# Altium footprint library Vowstar_Basic_Device.PcbLib: 170 footprints (part 7 of 11)
Each footprint in its own frame and in the unit in brackets; x right, y up, seen from the top. Pads: shape width x height; smd on the part's side, far side on the other; paste and mask are expansions set on the pad; w line width, h text height; cw(c..) or ccw(c..) is an arc to the next point about the centre after c.
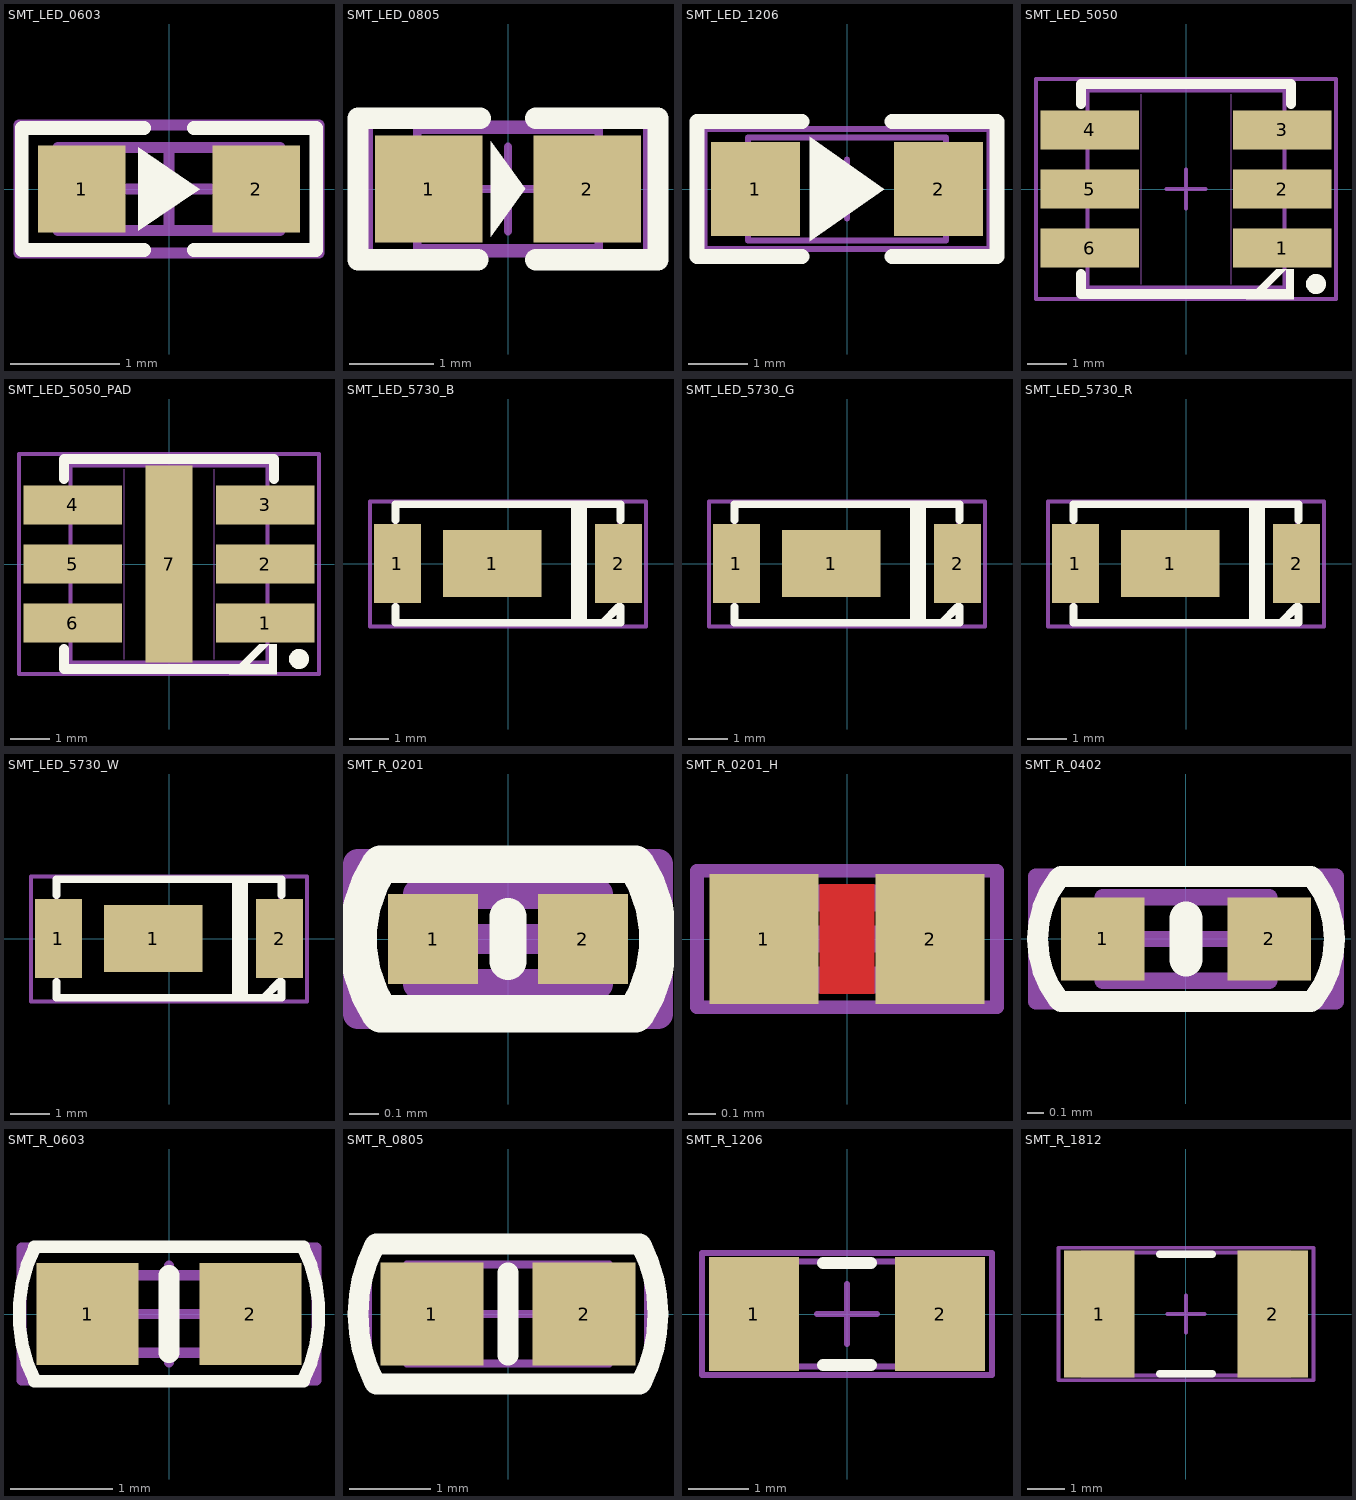
[diagram p6: the footprints below, top view; thin cyan lines are the x and y axes]

## SMT_LED_0603 [mm] "SMT LED"
height 0.85
pads (2):
  rect 0.8x0.8 smd: 1(-0.8,0) 2(0.8,0)
Top Overlay:
  region: -0.279,0.381 0.279,0 -0.279,-0.381
  lines w0.127: -0.229,-0.559 -1.346,-0.559 -1.346,0.559 -0.229,0.559 ; 0.229,-0.559 1.346,-0.559 1.346,0.559 0.229,0.559
Mechanical 13:
  lines w0.1: -1.016,-0.381 -1.016,0.381 1.016,0.381 1.016,-0.381 -1.016,-0.381
Mechanical 15:
  lines w0.1: -0.381,0 0.381,0 ; 0,-0.381 0,0.381 ; -1.372,-0.584 -1.372,0.584 1.372,0.584 1.372,-0.584 -1.372,-0.584
3D body "User Library-0603(1608M) LED.step": height 0.6, standoff 0, extent -0.81,-0.4 0.81,0.4

## SMT_LED_0805 [mil] "SMT LED"
height 60
pads (2):
  rect 50x50 smd: 1(-37,0) 2(37,0)
Top Overlay:
  region: -8,22.22 8,0 -8,-22.22
  lines w10: -14,-33 -70,-33 -70,33 -13,33 ; 13,-33 70,-33 70,33 13,33
Mechanical 13:
  lines w3.94: -42.32,-27.56 42.32,-27.56 42.32,27.56 -42.32,27.56 -42.32,-27.56
Mechanical 15:
  lines w3.94: -19.69,0 19.68,0 ; 0,-19.68 0,19.69 ; -65,-30 65,-30 65,30 -65,30 -65,-30
3D body "User Library-0805(2012M) LED.step": height 43.31, standoff 0, extent -39.53,-24.21 40,25

## SMT_LED_1206 [mm] "Surface mount resistor 1206"
height 0.71
pads (2):
  rect 1.5x1.6 smd: 1(-1.55,0) 2(1.55,0)
Top Overlay:
  region: -0.635,0.889 0.635,0 -0.635,-0.889
  lines w0.254: -0.762,-1.143 -2.54,-1.143 -2.54,1.143 -0.762,1.143 ; 0.762,-1.143 2.54,-1.143 2.54,1.143 0.762,1.143
Mechanical 13:
  lines w0.1: -1.675,-0.875 -1.675,0.875 1.675,0.875 1.675,-0.875 -1.675,-0.875
Mechanical 15:
  lines w0.1: -0.5,0 0.5,0 ; 0,-0.5 0,0.5 ; -2.413,-1.016 -2.413,1.016 2.413,1.016 2.413,-1.016 -2.413,-1.016
3D body "User Library-1206(3216M) LED.step": height 1.1, standoff 0, extent -1.61,-0.8 1.61,0.8

## SMT_LED_5050 [mm] "SMT LED"
height 1.3
pads (6):
  rect 2.5x1 smd: 1(2.45,-1.5) 2(2.45,0) 3(2.45,1.5) 4(-2.45,1.5) 5(-2.45,0) 6(-2.45,-1.5)
Top Overlay:
  circle w0.254: c3.302,-2.413 r0.127
  region: 1.524,-2.794 2.73,-2.794 2.73,-2.032 2.54,-2.032 2.54,-2.54 2.032,-2.54 2.54,-2.032 2.286,-2.032
  lines w0.254: -2.667,-2.159 -2.667,-2.667 1.778,-2.667 ; -2.667,2.159 -2.667,2.667 2.667,2.667 2.667,2.159
Mechanical 13:
  lines w0.02: -1.143,-2.413 -1.143,2.413 ; 1.143,-2.413 1.143,2.413
  lines w0.1: -2.5,-2.5 -2.5,2.5 2.5,2.5 2.5,-2.5 -2.5,-2.5
Mechanical 15:
  lines w0.1: -0.5,0 0.5,0 ; 0,-0.5 0,0.5 ; -3.81,-2.794 -3.81,2.794 3.81,2.794 3.81,-2.794 -3.81,-2.794
3D body "User Library-LED-SMD-5050.step": height 1.6, standoff 0, extent -2.65,-2.5 2.65,2.5

## SMT_LED_5050_PAD [mm] "SMT LED"
height 1.3
pads (7):
  rect 2.5x1 smd: 1(2.45,-1.5) 2(2.45,0) 3(2.45,1.5) 4(-2.45,1.5) 5(-2.45,0) 6(-2.45,-1.5)
  rect 1.2x5 smd: 7(0,0)
Top Overlay:
  circle w0.254: c3.302,-2.413 r0.127
  region: 1.524,-2.794 2.73,-2.794 2.73,-2.032 2.54,-2.032 2.54,-2.54 2.032,-2.54 2.54,-2.032 2.286,-2.032
  lines w0.254: -2.667,-2.159 -2.667,-2.667 1.778,-2.667 ; -2.667,2.159 -2.667,2.667 2.667,2.667 2.667,2.159
Mechanical 13:
  lines w0.02: -1.143,-2.413 -1.143,2.413 ; 1.143,-2.413 1.143,2.413
  lines w0.1: -2.5,-2.5 2.5,-2.5 2.5,2.5 -2.5,2.5 -2.5,-2.5
Mechanical 15:
  lines w0.1: -0.5,0 0.5,0 ; 0,-0.5 0,0.5 ; -3.81,-2.794 3.81,-2.794 3.81,2.794 -3.81,2.794 -3.81,-2.794
3D body "User Library-LED-SMD-5050.step": height 1.6, standoff 0, extent -2.65,-2.5 2.65,2.5

## SMT_LED_5730_B [mm] "SMT LED 5730 Package"
height 0.85
pads (3):
  rect 1.2x2 smd: 1(-2.8,0) 2(2.8,0)
  rect 2.5x1.7 smd: 1(-0.4,0)
Top Overlay:
  rectangle: 1.6,-1.5 2,1.5
  lines w0.2: -2.85,-1.1 -2.85,-1.5 2.85,-1.5 2.85,-1.1 ; -2.85,1.1 -2.85,1.5 2.85,1.5 2.85,1.1 ; 2.4,-1.5 2.8,-1.1
Mechanical 13:
  lines w0.1: -2.85,-1.5 2.825,-1.5 2.825,1.475 -2.85,1.475 -2.85,-1.5
Mechanical 15:
  lines w0.1: -0.5,0 0.5,0 ; 0,-0.5 0,0.5 ; -3.5,-1.6 -3.5,1.575 3.5,1.575 3.5,-1.6 -3.5,-1.6
3D body "B.STEP": height 0.9, standoff 0, extent -2.839,-1.499 2.861,1.501

## SMT_LED_5730_G [mm] "SMT LED 5730 Package"
height 0.85
pads (3):
  rect 1.2x2 smd: 1(-2.8,0) 2(2.8,0)
  rect 2.5x1.7 smd: 1(-0.4,0)
Top Overlay:
  rectangle: 1.6,-1.5 2,1.5
  lines w0.2: -2.85,-1.1 -2.85,-1.5 2.85,-1.5 2.85,-1.1 ; -2.85,1.1 -2.85,1.5 2.85,1.5 2.85,1.1 ; 2.4,-1.5 2.8,-1.1
Mechanical 13:
  lines w0.1: -2.85,-1.5 2.825,-1.5 2.825,1.475 -2.85,1.475 -2.85,-1.5
Mechanical 15:
  lines w0.1: -0.5,0 0.5,0 ; 0,-0.5 0,0.5 ; -3.5,-1.6 -3.5,1.575 3.5,1.575 3.5,-1.6 -3.5,-1.6
3D body "G.STEP": height 0.9, standoff 0, extent -2.845,-1.5 2.855,1.5

## SMT_LED_5730_R [mm] "SMT LED 5730 Package"
height 0.85
pads (3):
  rect 1.2x2 smd: 1(-2.8,0) 2(2.8,0)
  rect 2.5x1.7 smd: 1(-0.4,0)
Top Overlay:
  rectangle: 1.6,-1.5 2,1.5
  lines w0.2: -2.85,-1.1 -2.85,-1.5 2.85,-1.5 2.85,-1.1 ; -2.85,1.1 -2.85,1.5 2.85,1.5 2.85,1.1 ; 2.4,-1.5 2.8,-1.1
Mechanical 13:
  lines w0.1: -2.85,-1.5 2.825,-1.5 2.825,1.475 -2.85,1.475 -2.85,-1.5
Mechanical 15:
  lines w0.1: -0.5,0 0.5,0 ; 0,-0.5 0,0.5 ; -3.5,-1.6 -3.5,1.575 3.5,1.575 3.5,-1.6 -3.5,-1.6
3D body "R.STEP": height 0.9, standoff 0, extent -2.845,-1.499 2.855,1.501

## SMT_LED_5730_W [mm] "SMT LED 5730 Package"
height 0.85
pads (3):
  rect 1.2x2 smd: 1(-2.8,0) 2(2.8,0)
  rect 2.5x1.7 smd: 1(-0.4,0)
Top Overlay:
  rectangle: 1.6,-1.5 2,1.5
  lines w0.2: -2.85,-1.1 -2.85,-1.5 2.85,-1.5 2.85,-1.1 ; -2.85,1.1 -2.85,1.5 2.85,1.5 2.85,1.1 ; 2.4,-1.5 2.8,-1.1
Mechanical 13:
  lines w0.1: -2.85,-1.5 -2.85,1.475 2.825,1.475 2.825,-1.5 -2.85,-1.5
Mechanical 15:
  lines w0.1: -0.5,0 0.5,0 ; 0,-0.5 0,0.5 ; -3.5,-1.6 3.5,-1.6 3.5,1.575 -3.5,1.575 -3.5,-1.6
3D body "User Library-PLCC-2white.STEP": height 0.9, standoff 0, extent -2.86,-1.51 2.84,1.49

## SMT_R_0201 [mil] "Surface mount resistor 0201"
height 11.81
pads (2):
  rect 12x12 smd: 1(-10,0) 2(10,0)
Top Overlay:
  lines w5: 0,-3 0,3 ; -17,-10 cw(c-1.83,0) -17,10 17,10 cw(c1.83,0) 17,-10 -17,-10
Mechanical 13:
  lines w3.94: -12,-6 -12,6 12,6 12,-6 -12,-6
Mechanical 15:
  lines w3.94: -5,0 5,0 ; 0,-5 0,5 ; -20,-10 -20,10 20,10 20,-10 -20,-10
3D body "User Library-0201(0603M) Res.step": height 12.1, standoff 0, extent -11.99,-5.99 12.01,6.01

## SMT_R_0201_H [mm] "Chip Resistor, 2-Leads, Body 0.60x0.30mm, IPC High Density"
height 0.2
pads (2):
  rect 0.4x0.475 smd paste-1 mask-1: 1(-0.305,0) 2(0.305,0)
Top Layer:
  pour cut-out: -0.1,0.2 -0.1,-0.2 0.1,-0.2 0.1,0.2
Top Paste:
  region: 0.43,0.163 0.105,0.163 0.105,-0.162 0.43,-0.162
  rectangle: -0.43,-0.162 -0.105,0.162
Top Solder:
  rectangle: -0.43,-0.163 0.43,0.162
Mechanical 13:
  lines w0.1: -0.3,-0.15 -0.3,0.15 0.3,0.15 0.3,-0.15 -0.3,-0.15
Mechanical 15:
  lines w0.05: -0.55,-0.25 -0.55,0.25 0.55,0.25 0.55,-0.25 -0.55,-0.25
  lines w0.1: -0.15,0 0.15,0 ; 0,-0.15 0,0.15
3D body "User Library-0201(0603M) Res.step": height 0.31, standoff 0, extent -0.305,-0.152 0.305,0.153

## SMT_R_0402 [mil] "Surface mount resistor 0402"
height 11.81
pads (2):
  rect 20x20 smd: 1(-20,0) 2(20,0)
Top Overlay:
  lines w5: -30.54,-14.64 cw(c-12,0) -30.54,14.64 ; -30,-15 30,-15 ; -30,15 30,15 ; 30.54,-14.64 ccw(c12,0) 30.54,14.64
  lines w8: 0,-5 0,5
Mechanical 13:
  lines w3.94: -20,-10 -20,10 20,10 20,-10 -20,-10
Mechanical 15:
  lines w3.94: -10,0 10,0 ; 0,-10 0,10 ; -36,-15 -36,15 36,15 36,-15 -36,-15
3D body "User Library-0402(1005M) Res.step": height 20.1, standoff 0, extent -20,-10 20,10

## SMT_R_0603 [mm] "Surface mount resistor 0603"
height 0.85
pads (2):
  rect 1x1 smd: 1(-0.8,0) 2(0.8,0)
Top Overlay:
  lines w0.127: -1.321,-0.66 1.321,-0.66 ; -1.321,0.66 1.321,0.66 ; -1.318,-0.659 cw(c0,0) -1.318,0.659 ; 1.318,-0.659 ccw(c0,0) 1.318,0.659
  lines w0.203: 0,-0.381 0,0.381
Mechanical 13:
  lines w0.1: -1.016,-0.381 1.016,-0.381 1.016,0.381 -1.016,0.381 -1.016,-0.381
Mechanical 15:
  lines w0.1: -0.475,0 0.475,0 ; 0,-0.475 0,0.475 ; -1.448,-0.65 1.448,-0.65 1.448,0.65 -1.448,0.65 -1.448,-0.65
3D body "User Library-0603 SMD Resistor.step": height 0.79, standoff 0, extent -1,-0.394 1,0.394

## SMT_R_0805 [mil] "Surface mount resistor 0805"
height 70
pads (2):
  rect 50x50 smd: 1(-37,0) 2(37,0)
Top Overlay:
  lines w10: -64.54,-33.76 cw(c0,0) -64.54,33.76 ; -64,-34 64,-34 ; -64,34 64,34 ; 0,-20 0,20 ; 64.54,-33.76 ccw(c0,0) 64.54,33.76
Mechanical 13:
  lines w3.94: -49,-24 49,-24 49,24 -49,24 -49,-24
Mechanical 15:
  lines w3.94: -19.68,0 19.69,0 ; 0,-19.69 0,19.68 ; -68,-31 -68,31 68,31 68,-31 -68,-31
3D body "User Library-0805(2012M) Res.step": height 31.1, standoff 0, extent -49.37,-24.5 49.38,24.5

## SMT_R_1206 [mm] "Surface mount resistor 1206"
height 0.71
pads (2):
  rect 1.5x1.9 smd: 1(-1.55,0) 2(1.55,0)
Top Overlay:
  lines w0.2: -0.4,-0.85 0.4,-0.85 ; -0.4,0.85 0.4,0.85
Mechanical 13:
  lines w0.1: -1.675,-0.875 1.675,-0.875 1.675,0.875 -1.675,0.875 -1.675,-0.875
Mechanical 15:
  lines w0.1: -0.5,0 0.5,0 ; 0,-0.5 0,0.5 ; -2.413,-1.016 2.413,-1.016 2.413,1.016 -2.413,1.016 -2.413,-1.016
3D body "User Library-1206(3216M) Res.step": height 1.53, standoff 0, extent -2,-0.8 2,0.8

## SMT_R_1812 [mm] "Surface mount resistor 1812"
height 1.7
pads (2):
  rect 1.9x3.4 smd: 1(-2.331,0) 2(2.331,0)
Top Overlay:
  lines w0.2: -0.7,-1.6 0.7,-1.6 ; -0.7,1.6 0.7,1.6
Mechanical 13:
  lines w0.1: -2.794,-1.651 -2.794,1.651 2.794,1.651 2.794,-1.651 -2.794,-1.651
Mechanical 15:
  lines w0.1: -0.5,0 0.5,0 ; 0,-0.5 0,0.5 ; -3.429,-1.778 -3.429,1.778 3.429,1.778 3.429,-1.778 -3.429,-1.778
3D body "User Library-1812(4532M) Res.step": height 2.54, standoff 0, extent -2.81,-1.6 2.81,1.6